# Altium footprint library FTP.PcbLib: 70 footprints (part 2 of 5)
Each footprint in its own frame and in the unit in brackets; x right, y up, seen from the top. Pads: shape width x height; smd on the part's side, far side on the other; paste and mask are expansions set on the pad; w line width, h text height; cw(c..) or ccw(c..) is an arc to the next point about the centre after c.
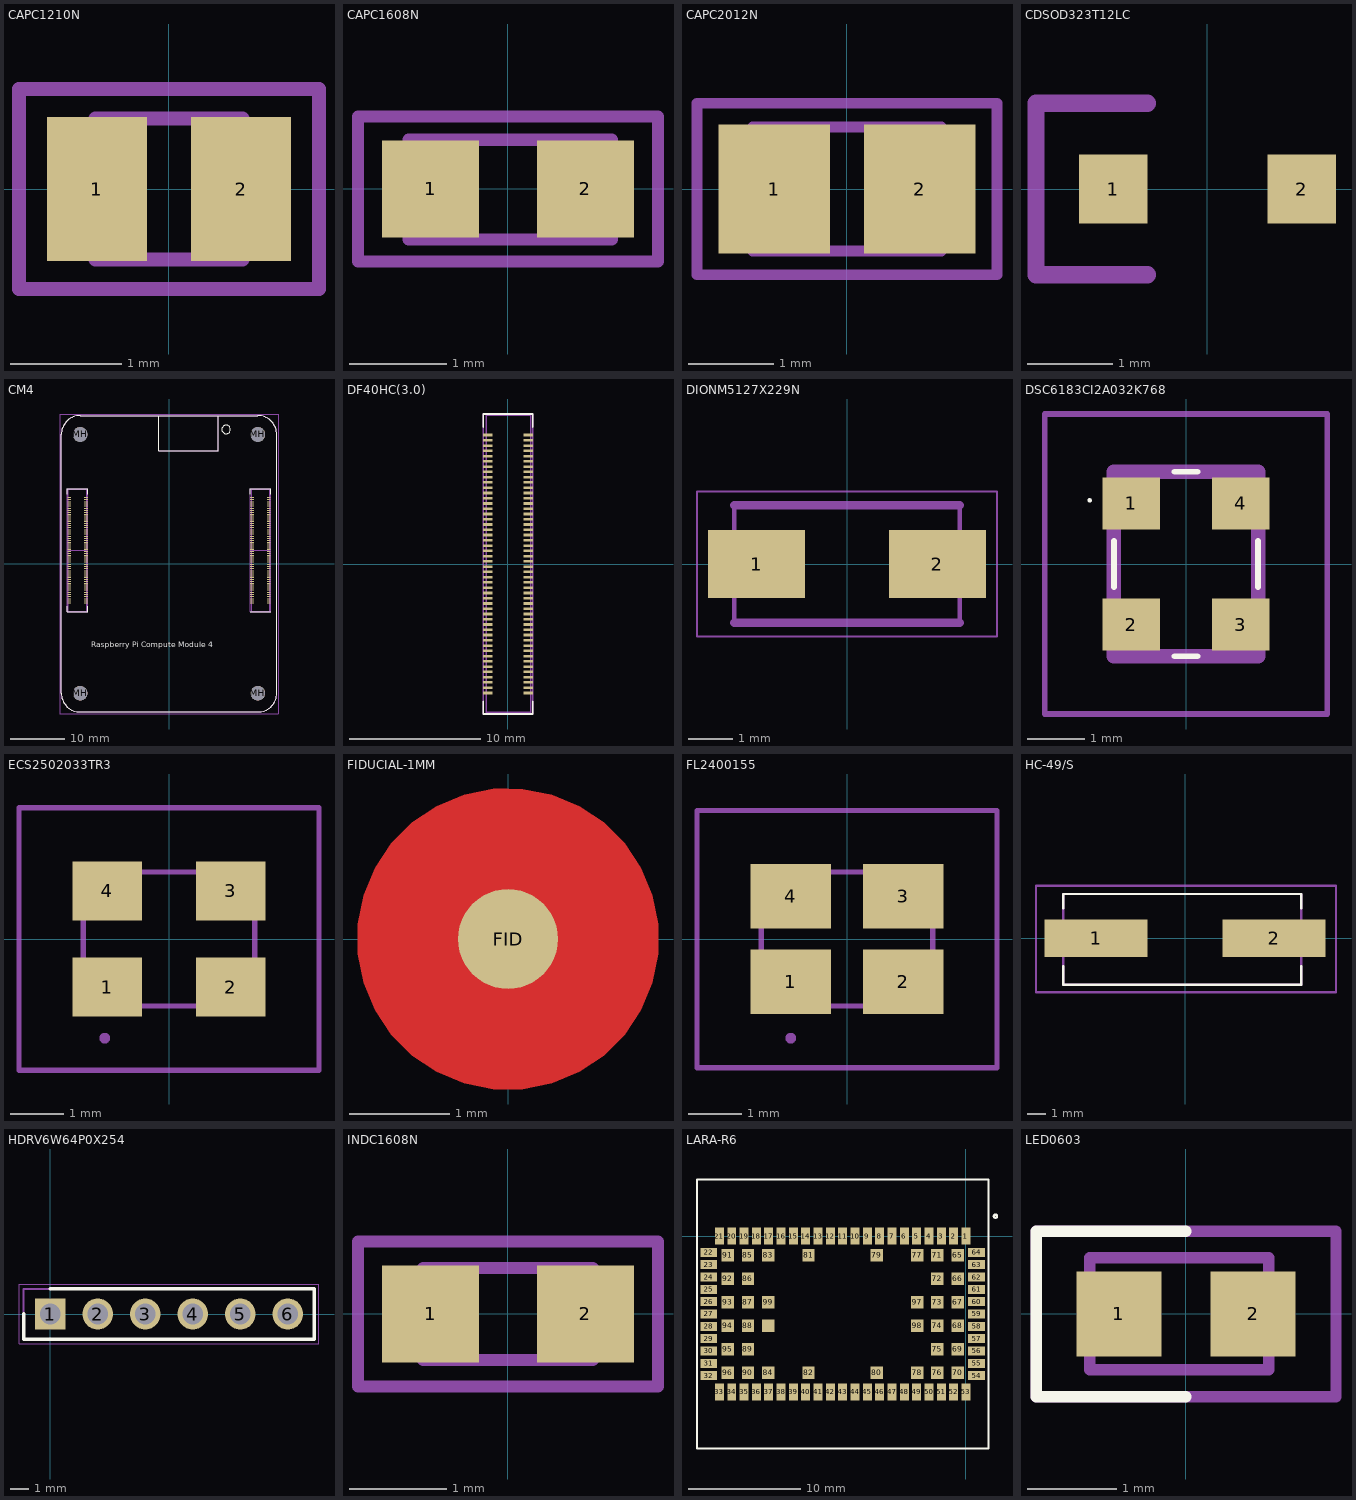
[diagram p1: the footprints below, top view; thin cyan lines are the x and y axes]

## CAPC1210N [mm] "Chip Capacitor, Body 1.2x1.0mm, IPC Medium Density"
height 1.02
pads (2):
  rect 0.9x1.3 smd: 1(-0.65,0) 2(0.65,0)
Mechanical 13:
  lines w0.127: -0.66,-0.635 0.66,-0.635 0.66,0.635 -0.66,0.635 -0.66,-0.635
Mechanical 15:
  lines w0.127: -1.35,-0.9 1.35,-0.9 1.35,0.9 -1.35,0.9 -1.35,-0.9
  text "+" at -0.495,-0.76 h1.5
3D body: height 1.02, standoff 0, extent -0.66,-0.635 0.66,0.635

## CAPC1608N [mm]
pads (2):
  rect 1x1 smd: 1(-0.8,0) 2(0.8,0)
Mechanical 13:
  lines w0.127: -1.029,-0.521 -1.029,0.508 1.072,0.508 1.072,-0.521 -1.029,-0.521
Mechanical 15:
  lines w0.127: -1.55,-0.75 1.55,-0.75 1.55,0.75 -1.55,0.75 -1.55,-0.75
  text "+" at -0.499,-0.755 h1.5
3D body "CAPC0603.STEP": height 0.81, standoff 0.01, extent -1.029,-0.521 1.072,0.508

## CAPC2012N [mm] "Chip Capacitor, Body 2.0x1.3mm, IPC Medium Density"
height 1.1
pads (2):
  rect 1.3x1.5 smd: 1(-0.85,0) 2(0.85,0)
Mechanical 13:
  lines w0.127: -1.1,-0.725 -1.1,0.725 1.1,0.725 1.1,-0.725 -1.1,-0.725
Mechanical 15:
  lines w0.127: -1.75,-1 -1.75,1 1.75,1 1.75,-1 -1.75,-1
  text "+" at -0.492,-0.771 h1.5
3D body: height 1.1, standoff 0, extent -1.1,-0.725 1.1,0.725

## CDSOD323T12LC [mil]
pads (2):
  rect 31.5x31.5 smd: 1(-43.31,0) 2(43.31,0)
Top Assembly:
  lines w7.87: -27.56,-39.37 -78.74,-39.37 -78.74,39.37 -27.56,39.37
3D body "CDSOD323-T12LC.stp": height 48.82, standoff 0, extent -55.91,-25.59 55.91,25.59

## CM4 [mm]
pads (204):
  rect 0.7x0.2 smd: 1(18.5,-7.3) 2(15.42,-7.3) 3(18.5,-6.9) 4(15.42,-6.9) 5(18.5,-6.5) 6(15.42,-6.5) 7(18.5,-6.1) 8(15.42,-6.1) 9(18.5,-5.7) 10(15.42,-5.7) 11(18.5,-5.3) 12(15.42,-5.3) 13(18.5,-4.9) 14(15.42,-4.9) 15(18.5,-4.5) 16(15.42,-4.5) 17(18.5,-4.1) 18(15.42,-4.1) 19(18.5,-3.7) 20(15.42,-3.7) 21(18.5,-3.3) 22(15.42,-3.3) 23(18.5,-2.9) 24(15.42,-2.9) 25(18.5,-2.5) 26(15.42,-2.5) 27(18.5,-2.1) 28(15.42,-2.1) 29(18.5,-1.7) 30(15.42,-1.7) 31(18.5,-1.3) 32(15.42,-1.3) 33(18.5,-0.9) 34(15.42,-0.9) 35(18.5,-0.5) 36(15.42,-0.5) 37(18.5,-0.1) 38(15.42,-0.1) 39(18.5,0.3) 40(15.42,0.3) 41(18.5,0.7) 42(15.42,0.7) 43(18.5,1.1) 44(15.42,1.1) 45(18.5,1.5) 46(15.42,1.5) 47(18.5,1.9) 48(15.42,1.9) 49(18.5,2.3) 50(15.42,2.3) 51(18.5,2.7) 52(15.42,2.7) 53(18.5,3.1) 54(15.42,3.1) 55(18.5,3.5) 56(15.42,3.5) 57(18.5,3.9) 58(15.42,3.9) 59(18.5,4.3) 60(15.42,4.3) 61(18.5,4.7) 62(15.42,4.7) 63(18.5,5.1) 64(15.42,5.1) 65(18.5,5.5) 66(15.42,5.5) 67(18.5,5.9) 68(15.42,5.9) 69(18.5,6.3) 70(15.42,6.3) 71(18.5,6.7) 72(15.42,6.7) 73(18.5,7.1) 74(15.42,7.1) 75(18.5,7.5) 76(15.42,7.5) 77(18.5,7.9) 78(15.42,7.9) 79(18.5,8.3) 80(15.42,8.3) 81(18.5,8.7) 82(15.42,8.7) 83(18.5,9.1) 84(15.42,9.1) 85(18.5,9.5) 86(15.42,9.5) 87(18.5,9.9) 88(15.42,9.9) 89(18.5,10.3) 90(15.42,10.3) 91(18.5,10.7) 92(15.42,10.7) 93(18.5,11.1) 94(15.42,11.1) 95(18.5,11.5) 96(15.42,11.5) 97(18.5,11.9) 98(15.42,11.9) 99(18.5,12.3) 100(15.42,12.3) 101(-15.42,-7.3) 102(-18.5,-7.3) 103(-15.42,-6.9) 104(-18.5,-6.9) 105(-15.42,-6.5) 106(-18.5,-6.5) 107(-15.42,-6.1) 108(-18.5,-6.1) 109(-15.42,-5.7) 110(-18.5,-5.7) 111(-15.42,-5.3) 112(-18.5,-5.3) 113(-15.42,-4.9) 114(-18.5,-4.9) 115(-15.42,-4.5) 116(-18.5,-4.5) 117(-15.42,-4.1) 118(-18.5,-4.1) 119(-15.42,-3.7) 120(-18.5,-3.7) 121(-15.42,-3.3) 122(-18.5,-3.3) 123(-15.42,-2.9) 124(-18.5,-2.9) 125(-15.42,-2.5) 126(-18.5,-2.5) 127(-15.42,-2.1) 128(-18.5,-2.1) 129(-15.42,-1.7) 130(-18.5,-1.7) 131(-15.42,-1.3) 132(-18.5,-1.3) 133(-15.42,-0.9) 134(-18.5,-0.9) 135(-15.42,-0.5) 136(-18.5,-0.5) 137(-15.42,-0.1) 138(-18.5,-0.1) 139(-15.42,0.3) 140(-18.5,0.3) 141(-15.42,0.7) 142(-18.5,0.7) 143(-15.42,1.1) 144(-18.5,1.1) 145(-15.42,1.5) 146(-18.5,1.5) 147(-15.42,1.9) 148(-18.5,1.9) 149(-15.42,2.3) 150(-18.5,2.3) 151(-15.42,2.7) 152(-18.5,2.7) 153(-15.42,3.1) 154(-18.5,3.1) 155(-15.42,3.5) 156(-18.5,3.5) 157(-15.42,3.9) 158(-18.5,3.9) 159(-15.42,4.3) 160(-18.5,4.3) 161(-15.42,4.7) 162(-18.5,4.7) 163(-15.42,5.1) 164(-18.5,5.1) 165(-15.42,5.5) 166(-18.5,5.5) 167(-15.42,5.9) 168(-18.5,5.9) 169(-15.42,6.3) 170(-18.5,6.3) 171(-15.42,6.7) 172(-18.5,6.7) 173(-15.42,7.1) 174(-18.5,7.1) 175(-15.42,7.5) 176(-18.5,7.5) 177(-15.42,7.9) 178(-18.5,7.9) 179(-15.42,8.3) 180(-18.5,8.3) 181(-15.42,8.7) 182(-18.5,8.7) 183(-15.42,9.1) 184(-18.5,9.1) 185(-15.42,9.5) 186(-18.5,9.5) 187(-15.42,9.9) 188(-18.5,9.9) 189(-15.42,10.3) 190(-18.5,10.3) 191(-15.42,10.7) 192(-18.5,10.7) 193(-15.42,11.1) 194(-18.5,11.1) 195(-15.42,11.5) 196(-18.5,11.5) 197(-15.42,11.9) 198(-18.5,11.9) 199(-15.42,12.3) 200(-18.5,12.3)
  round 2.7 hole 2.7 paste-2539.97 mask+1.7: MH(-16.5,-24) MH(-16.5,24) MH(16.5,-24) MH(16.5,24)
Top Overlay:
  circle w0.127: c10.6,24.933 r0.8
  lines w0.127: -18.85,-7.9 -18.85,-8.9 -15.07,-8.9 -15.07,-7.9 ; -18.85,12.9 -18.85,13.9 -15.07,13.9 -15.07,12.9 ; -1.9,27.5 -1.9,21 9.1,21 9.1,27.5 ; 15.07,-8.9 18.85,-8.9 ; 15.07,12.9 15.07,13.9 18.85,13.9 18.85,12.9 ; -20,-24 ccw(c-16.5,-24) -16.5,-27.5 16.5,-27.5 ccw(c16.5,-24) 20,-24 20,24 ccw(c16.5,24) 16.5,27.5 -16.5,27.5 ccw(c-16.5,24) -20,24 -20,-24
  text "." at 20.9,-7.4 h0.76
  text "Raspberry Pi Compute Module 4" at -14.446,-15.513 h1
Mechanical 6:
  lines w0.12: -18.85,-8.9 -15.07,-8.9 ; -18.85,-8.9 -15.07,-8.9 ; -18.85,-8.9 -18.85,13.9 ; -18.85,-8.9 -18.85,13.9 ; -18.85,13.9 -15.07,13.9 ; -18.85,13.9 -15.07,13.9 ; -15.07,-8.9 -15.07,13.9 ; -15.07,-8.9 -15.07,13.9 ; 15.07,-8.9 18.85,-8.9 ; 15.07,-8.9 18.85,-8.9 ; 15.07,-8.9 15.07,13.9 ; 15.07,-8.9 15.07,13.9 ; 15.07,13.9 18.85,13.9 ; 15.07,13.9 18.85,13.9 ; 18.85,-8.9 18.85,13.9 ; 18.85,-8.9 18.85,13.9 ; -18.83,2.5 -15.05,2.5 -18.83,2.5 ; 15.07,2.5 18.85,2.5 15.07,2.5
  text "CAM1" at -16.9,0.749 h0.7
  text "DSI0" at -16.9,6.949 h0.7
  text "USB" at -16.9,-4.134 h0.7
  text "TV" at -17,-2.751 h0.7
  text "HDMI0" at -18,10.375 h0.7
  text "CAM0" at -18,0.783 h0.7
  text "DS1" at -17.5,13.049 h0.7
  text "HDMI1" at -18.1,5.958 h0.7
  text "PCIe" at -18,-3.051 h0.7
  text "3V3" at 15.8,8.625 h0.7
  text "1V8" at 15.8,11.225 h0.7
  text "GPIO" at 16.5,0.625 h0.7
  text "5V" at 17,9.9 h0.7
  text "SD" at 16.4,6.991 h0.7
  text "ETH" at 16.5,-4.751 h0.7
Mechanical 13:
  lines w0.127: -20,-24 ccw(c-16.5,-24) -16.5,-27.5 16.5,-27.5 ccw(c16.5,-24) 20,-24 20,24 ccw(c16.5,24) 16.5,27.5 -16.5,27.5 ccw(c-16.5,24) -20,24 -20,-24 ; -18.69,-8.785 -18.69,13.815 -15.31,13.815 -15.31,-8.785 -18.69,-8.785 ; 15.31,-8.785 15.31,13.815 18.69,13.815 18.69,-8.785 15.31,-8.785
Mechanical 15:
  lines w0.127: -20.316,-27.873 20.3,-27.873 20.3,27.8 -20.316,27.8 -20.316,-27.873 ; -18.85,-8.9 -18.85,13.9 -15.07,13.9 -15.07,-8.9 -18.85,-8.9 ; 15.07,-8.9 15.07,13.9 18.85,13.9 18.85,-8.9 15.07,-8.9
  text "+" at -0.507,-0.753 h1.5
Mechanical 16:
  lines w0.127: -1.9,27.5 -1.9,21 9.1,21 9.1,27.5
  text "Wireless / Cutout" at -1.532,22.9 h0.9
3D body "DF40HC(3.0)-100DS-0.4V.stp": height 2.9, standoff 0, extent 15.31,-8.785 18.69,13.815
3D body "DF40HC(3.0)-100DS-0.4V.stp": height 2.9, standoff 0, extent -18.69,-8.785 -15.31,13.815
3D body "CM4Lite-step.STEP": height 6.65, standoff 1.87, extent -19.95,-27.5 20.05,27.5

## DF40HC(3.0) [mm]
pads (100):
  rect 0.7x0.2 smd: 1(1.54,-9.8) 2(-1.54,-9.8) 3(1.54,-9.4) 4(-1.54,-9.4) 5(1.54,-9) 6(-1.54,-9) 7(1.54,-8.6) 8(-1.54,-8.6) 9(1.54,-8.2) 10(-1.54,-8.2) 11(1.54,-7.8) 12(-1.54,-7.8) 13(1.54,-7.4) 14(-1.54,-7.4) 15(1.54,-7) 16(-1.54,-7) 17(1.54,-6.6) 18(-1.54,-6.6) 19(1.54,-6.2) 20(-1.54,-6.2) 21(1.54,-5.8) 22(-1.54,-5.8) 23(1.54,-5.4) 24(-1.54,-5.4) 25(1.54,-5) 26(-1.54,-5) 27(1.54,-4.6) 28(-1.54,-4.6) 29(1.54,-4.2) 30(-1.54,-4.2) 31(1.54,-3.8) 32(-1.54,-3.8) 33(1.54,-3.4) 34(-1.54,-3.4) 35(1.54,-3) 36(-1.54,-3) 37(1.54,-2.6) 38(-1.54,-2.6) 39(1.54,-2.2) 40(-1.54,-2.2) 41(1.54,-1.8) 42(-1.54,-1.8) 43(1.54,-1.4) 44(-1.54,-1.4) 45(1.54,-1) 46(-1.54,-1) 47(1.54,-0.6) 48(-1.54,-0.6) 49(1.54,-0.2) 50(-1.54,-0.2) 51(1.54,0.2) 52(-1.54,0.2) 53(1.54,0.6) 54(-1.54,0.6) 55(1.54,1) 56(-1.54,1) 57(1.54,1.4) 58(-1.54,1.4) 59(1.54,1.8) 60(-1.54,1.8) 61(1.54,2.2) 62(-1.54,2.2) 63(1.54,2.6) 64(-1.54,2.6) 65(1.54,3) 66(-1.54,3) 67(1.54,3.4) 68(-1.54,3.4) 69(1.54,3.8) 70(-1.54,3.8) 71(1.54,4.2) 72(-1.54,4.2) 73(1.54,4.6) 74(-1.54,4.6) 75(1.54,5) 76(-1.54,5) 77(1.54,5.4) 78(-1.54,5.4) 79(1.54,5.8) 80(-1.54,5.8) 81(1.54,6.2) 82(-1.54,6.2) 83(1.54,6.6) 84(-1.54,6.6) 85(1.54,7) 86(-1.54,7) 87(1.54,7.4) 88(-1.54,7.4) 89(1.54,7.8) 90(-1.54,7.8) 91(1.54,8.2) 92(-1.54,8.2) 93(1.54,8.6) 94(-1.54,8.6) 95(1.54,9) 96(-1.54,9) 97(1.54,9.4) 98(-1.54,9.4) 99(1.54,9.8) 100(-1.54,9.8)
Top Overlay:
  lines w0.127: -1.89,-10.443 -1.89,-11.4 1.89,-11.4 1.89,-10.443 ; -1.89,10.4 -1.89,11.4 1.89,11.4 1.89,10.4
  text "." at 2.774,-9.863 h0.76
Mechanical 13:
  lines w0.127: -1.65,-11.285 -1.65,11.315 1.73,11.315 1.73,-11.285 -1.65,-11.285
Mechanical 15:
  lines w0.127: -1.89,-11.4 1.89,-11.4 ; -1.89,-11.4 1.89,-11.4 ; -1.89,-11.4 -1.89,11.4 ; -1.89,-11.4 -1.89,11.4 ; -1.89,11.4 1.89,11.4 ; -1.89,11.4 1.89,11.4 ; 1.89,-11.4 1.89,11.4 ; 1.89,-11.4 1.89,11.4
  text "+" at -0.501,-0.754 h1.5
3D body "DF40HC(3.0)-100DS-0.4V.stp": height 2.9, standoff 0, extent -1.65,-11.285 1.73,11.315

## DIONM5127X229N [mm]
pads (2):
  rect 2.2x1.55 smd: 1(-2.05,0) 2(2.05,0)
Top Assembly:
  lines w0.05: -3.4,-1.645 3.4,-1.645 3.4,1.645 -3.4,1.645 -3.4,-1.645
  lines w0.1: -2.552,-1.332 2.552,-1.332 2.552,1.332 -2.552,1.332 -2.552,-1.332
Mechanical 7:
  lines w0.2: -2.552,-1.332 2.552,-1.332 ; -2.552,1.332 2.552,1.332
3D body "SMAJ24CA-Q.stp": height 2.29, standoff 0, extent -2.552,-1.332 2.552,1.332

## DSC6183CI2A032K768 [mm]
pads (4):
  rect 1x0.9 smd: 1(-0.95,1.05) 2(-0.95,-1.05) 3(0.95,-1.05) 4(0.95,1.05)
Top Overlay:
  lines w0.038: -1.689,1.104 cw(c-1.67,1.104) -1.651,1.104 cw(c-1.67,1.104) -1.689,1.104
  lines w0.1: -1.25,-0.4 -1.25,0.4 ; -0.2,-1.6 0.2,-1.6 ; -0.2,1.6 0.2,1.6 ; 1.25,-0.4 1.25,0.4
Mechanical 15:
  lines w0.254: -1.25,-1.6 -1.25,1.6 1.25,1.6 1.25,-1.6 -1.25,-1.6
Mechanical 20:
  lines w0.1: -2.45,-2.6 -2.45,2.6 2.45,2.6 2.45,-2.6 -2.45,-2.6
3D body "DSC1001CE5-025.0000T.stp": height 1, standoff 0, extent -1.36,-1.6 1.36,1.6

## ECS2502033TR3 [mm]
pads (4):
  rect 1.3x1.1 smd: 1(-1.15,-0.9) 2(1.15,-0.9) 3(1.15,0.9) 4(-1.15,0.9)
Top Assembly:
  lines w0.1: -2.8,-2.45 2.8,-2.45 2.8,2.45 -2.8,2.45 -2.8,-2.45 ; -1.6,-1.25 1.6,-1.25 1.6,1.25 -1.6,1.25 -1.6,-1.25
Mechanical 7:
  lines w0.1: -1.2,-1.9 cw(c-1.2,-1.85) -1.2,-1.8 cw(c-1.2,-1.85) -1.2,-1.9
3D body "ECS-250-20-33-TR3.stp": height 0.9, standoff 0, extent -1.69,-1.34 1.69,1.34

## FIDUCIAL-1MM [mm] "1MM FIDUCAL MARKER"
pads (1):
  round 1 smd paste-1 mask+0.5: FID(0,0)
Top Layer:
  pour cut-out: -1.5,0 -1.5,-0.148 -1.442,-0.438 -1.329,-0.711 -1.165,-0.956 -0.956,-1.165 -0.711,-1.329 -0.438,-1.442 -0.148,-1.5 0,-1.5 0.148,-1.5 0.438,-1.442 0.711,-1.329 0.956,-1.165 1.165,-0.956 1.329,-0.711 1.442,-0.438 1.5,-0.148 1.5,0 1.5,0.148 1.442,0.438 1.329,0.711 1.165,0.956 0.956,1.165 0.711,1.329 0.438,1.442 0.148,1.5 0,1.5 -0.148,1.5 -0.438,1.442 -0.711,1.329 -0.956,1.165 -1.165,0.956 -1.329,0.711 -1.442,0.438 -1.5,0.148

## FL2400155 [mil]
pads (4):
  rect 59.06x47.24 smd: 1(-41.34,-31.5) 2(41.34,-31.5) 3(41.34,31.5) 4(-41.34,31.5)
Top Assembly:
  lines w3.94: -110.24,-94.49 -110.24,94.49 110.24,94.49 110.24,-94.49 -110.24,-94.49 ; -62.99,-49.21 -62.99,49.21 62.99,49.21 62.99,-49.21 -62.99,-49.21
Mechanical 7:
  lines w3.94: -41.34,-74.8 ccw(c-41.34,-72.83) -41.34,-70.87 ccw(c-41.34,-72.83) -41.34,-74.8
3D body "FL2400155.stp": height 34.65, standoff 0, extent -66.14,-50.39 66.14,50.39

## HC-49/S [mm]
pads (2):
  rect 5.5x2 smd paste-0.025 mask+0.07: 1(-4.75,0) 2(4.75,0)
Top Overlay:
  lines w0.127: -6.5,-1.5 -6.5,-2.5 6.2,-2.5 6.2,-1.5 ; -6.5,1.6 -6.5,2.35 6.2,2.35 6.2,1.6
Mechanical 13:
  lines w0.127: -6.5,-2.5 -6.5,2.35 6.2,2.35 6.2,-2.5 -6.5,-2.5
Mechanical 15:
  lines w0.127: -7.95,-2.9 -7.95,2.8 8.05,2.8 8.05,-2.9 -7.95,-2.9
  text "+" at -0.507,-0.749 h1.5
3D body "SM49.stp": height 4.2, standoff 0, extent -6.5,-2.5 6.2,2.35

## HDRV6W64P0X254 [mm]
pads (6):
  rect 1.65x1.65 / inner round 1.65 / far side rect 1.65x1.65 hole 1.1: 1(0,0)
  round 1.65 hole 1.1: 2(2.54,0) 3(5.08,0) 4(7.62,0) 5(10.16,0) 6(12.7,0)
Top Overlay:
  lines w0.2: -1.42,0 -1.42,-1.345 14.12,-1.345 14.12,1.345 0,1.345
Mechanical 15:
  lines w0.1: -1.42,-1.345 14.12,-1.345 14.12,1.345 -1.42,1.345 -1.42,-1.345
Mechanical 20:
  lines w0.05: -1.67,-1.595 14.37,-1.595 14.37,1.595 -1.67,1.595 -1.67,-1.595
3D body "61300611121.stp": height 8.69, standoff -3.2, extent -1.27,-1.345 13.97,1.195

## INDC1608N [mm] "Chip Inductor, Body 1.6x0.8mm, IPC Medium Density"
height 0.71
pads (2):
  rect 1x1 smd: 1(-0.8,0) 2(0.8,0)
Mechanical 13:
  lines w0.127: -0.875,-0.475 0.875,-0.475 0.875,0.475 -0.875,0.475 -0.875,-0.475
Mechanical 15:
  lines w0.127: -1.55,-0.75 1.55,-0.75 1.55,0.75 -1.55,0.75 -1.55,-0.75
  text "+" at -0.503,-0.758 h1.5
3D body: height 0.71, standoff 0, extent -0.875,-0.475 0.875,0.475

## LARA-R6 [mm] "Footprint for LARA modules"
pads (100):
  rect 0.8x1.5 smd paste-2539.97: 1(0,0) 2(-1.1,0) 3(-2.2,0) 4(-3.3,0) 5(-4.4,0) 6(-5.5,0) 7(-6.6,0) 8(-7.7,0) 9(-8.8,0) 10(-9.9,0) 11(-11,0) 12(-12.1,0) 13(-13.2,0) 14(-14.3,0) 15(-15.4,0) 16(-16.5,0) 17(-17.6,0) 18(-18.7,0) 19(-19.8,0) 20(-20.9,0) 21(-22,0) 33(-22,-13.9) 34(-20.9,-13.9) 35(-19.8,-13.9) 36(-18.7,-13.9) 37(-17.6,-13.9) 38(-16.5,-13.9) 39(-15.4,-13.9) 40(-14.3,-13.9) 41(-13.2,-13.9) 42(-12.1,-13.9) 43(-11,-13.9) 44(-9.9,-13.9) 45(-8.8,-13.9) 46(-7.7,-13.9) 47(-6.6,-13.9) 48(-5.5,-13.9) 49(-4.4,-13.9) 50(-3.3,-13.9) 51(-2.2,-13.9) 52(-1.1,-13.9) 53(0,-13.9)
  rect 1.5x0.8 smd paste-2539.97: 22(-22.95,-1.45) 23(-22.95,-2.55) 24(-22.95,-3.65) 25(-22.95,-4.75) 26(-22.95,-5.85) 27(-22.95,-6.95) 28(-22.95,-8.05) 29(-22.95,-9.15) 30(-22.95,-10.25) 31(-22.95,-11.35) 32(-22.95,-12.45) 54(0.95,-12.45) 55(0.95,-11.35) 56(0.95,-10.25) 57(0.95,-9.15) 58(0.95,-8.05) 59(0.95,-6.95) 60(0.95,-5.85) 61(0.95,-4.75) 62(0.95,-3.65) 63(0.95,-2.55) 64(0.95,-1.45)
  rect 1.1x1.1 smd paste-0.025: 65(-0.75,-1.7) 66(-0.75,-3.8) 67(-0.75,-5.9) 68(-0.75,-8) 69(-0.75,-10.1) 70(-0.75,-12.2) 71(-2.55,-1.7) 72(-2.55,-3.8) 73(-2.55,-5.9) 74(-2.55,-8) 75(-2.55,-10.1) 76(-2.55,-12.2) 77(-4.35,-1.7) 78(-4.35,-12.2) 79(-7.95,-1.7) 80(-7.95,-12.2) 81(-14.05,-1.7) 82(-14.05,-12.2) 83(-17.65,-1.7) 84(-17.65,-12.2) 85(-19.45,-1.7) 86(-19.45,-3.8) 87(-19.45,-5.9) 88(-19.45,-8) 89(-19.45,-10.1) 90(-19.45,-12.2) 91(-21.25,-1.7) 92(-21.25,-3.8) 93(-21.25,-5.9) 94(-21.25,-8) 95(-21.25,-10.1) 96(-21.25,-12.2) 97(-4.35,-5.9) 98(-4.35,-8) 99(-17.65,-5.9) 100(-17.65,-8)
Top Overlay:
  circle w0.2: c2.625,1.775 r0.141
  lines w0.2: -24,-18.95 2,-18.95 2,5.05 -24,5.05 -24,-18.95
Top Paste:
  drawing of 64 lines, arcs and shapes, not listed
3D body "Lara.STEP": height 2.63, standoff 0.03, extent -24.029,-18.948 1.971,5.052

## LED0603 [mm]
pads (2):
  rect 0.95x0.95 smd: 1(-0.75,0) 2(0.75,0)
Top Overlay:
  lines w0.127: 0,-0.927 -1.673,-0.927 -1.673,0.924 0,0.924
Mechanical 13:
  lines w0.127: -1.075,-0.625 -1.075,0.625 0.925,0.625 0.925,-0.625 -1.075,-0.625
Mechanical 15:
  lines w0.127: -1.675,-0.925 1.675,-0.925 1.675,0.925 -1.675,0.925 -1.675,-0.925
3D body "150080BS75000_Download_STP_WL-SMCW-0805_rev1.stp": height 0.7, standoff 0, extent -1.075,-0.625 0.925,0.625